# Altium footprint library Connectors.PcbLib: 135 footprints (part 8 of 9)
Each footprint in its own frame and in the unit in brackets; x right, y up, seen from the top. Pads: shape width x height; smd on the part's side, far side on the other; paste and mask are expansions set on the pad; w line width, h text height; cw(c..) or ccw(c..) is an arc to the next point about the centre after c.
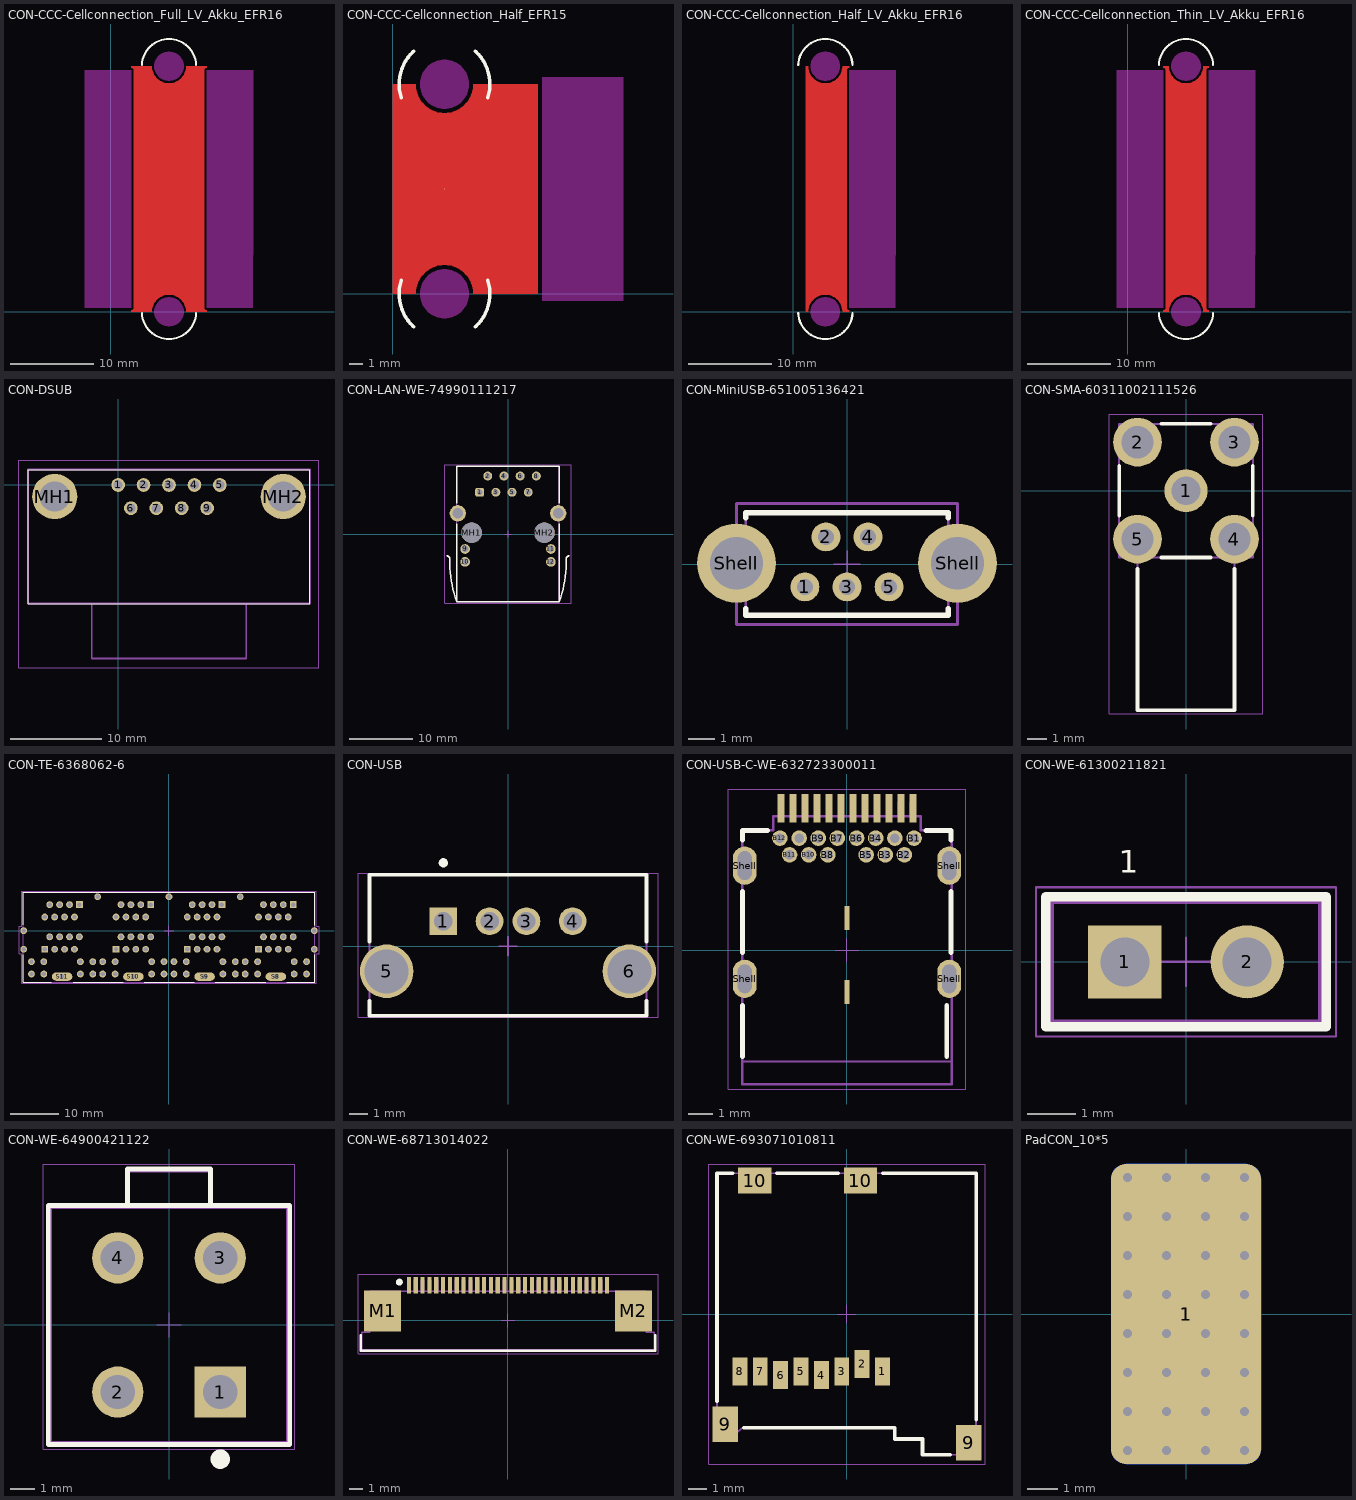
[diagram p7: the footprints below, top view; thin cyan lines are the x and y axes]

## CON-CCC-Cellconnection_Full_LV_Akku_EFR16 [mm]
pads (1):
  round 0.025 smd mask+0: 1(7,7.5)
Top Layer:
  region: 11.5,29.231 11.383,29.183 11.284,29.116 11.259,29.079 11.217,29.017 11.194,28.9 11.194,0.5 11.214,0.402 11.217,0.383 11.244,0.343 11.284,0.284 11.323,0.257 11.383,0.217 11.5,0.169 11.5,0 9.056,0 9.056,0.172 9.05,0.202 9.05,0.232 8.983,0.57 8.971,0.598 8.965,0.628 8.833,0.946 8.817,0.971 8.805,0.999 8.614,1.285 8.592,1.307 8.576,1.332 8.332,1.576 8.307,1.592 8.285,1.614 7.999,1.805 7.971,1.817 7.946,1.833 7.628,1.965 7.598,1.971 7.57,1.983 7.232,2.05 7.202,2.05 7.172,2.056 6.828,2.056 6.798,2.05 6.768,2.05 6.43,1.983 6.402,1.971 6.372,1.965 6.054,1.833 6.029,1.817 6.001,1.805 5.715,1.614 5.693,1.592 5.668,1.576 5.424,1.332 5.408,1.307 5.386,1.285 5.195,0.999 5.183,0.971 5.167,0.946 5.035,0.628 5.029,0.598 5.017,0.57 4.95,0.232 4.95,0.202 4.944,0.172 4.944,0 2.5,0 2.5,0.169 2.617,0.217 2.716,0.284 2.741,0.321 2.783,0.383 2.806,0.5 2.806,28.9 2.786,28.998 2.783,29.017 2.756,29.057 2.716,29.116 2.677,29.143 2.617,29.183 2.5,29.231 2.5,29.4 4.944,29.4 4.944,29.228 4.95,29.198 4.95,29.168 5.017,28.83 5.029,28.802 5.035,28.772 5.167,28.454 5.183,28.429 5.195,28.401 5.386,28.115 5.408,28.093 5.424,28.068 5.668,27.824 5.693,27.808 5.715,27.786 6.001,27.595 6.001,27.62 6.054,27.567 6.372,27.435 6.402,27.429 6.43,27.417 6.768,27.35 6.798,27.35 6.828,27.344 7.172,27.344 7.202,27.35 7.232,27.35 7.57,27.417 7.598,27.429 7.628,27.435 7.946,27.567 7.971,27.583 7.999,27.595 8.285,27.786 8.307,27.808 8.332,27.824 8.576,28.068 8.592,28.093 8.614,28.114 8.805,28.401 8.817,28.429 8.833,28.454 8.965,28.772 8.971,28.802 8.983,28.83 9.05,29.168 9.05,29.198 9.056,29.228 9.056,29.4 11.5,29.4
Top Overlay:
  lines w0.254: 3.754,-0.17 ccw(c7,0) 10.246,-0.17 ; 3.754,29.57 cw(c7,29.4) 10.246,29.57
Bottom Overlay:
  circle w0.254: c7,29.4 r3.25
  lines w0.254: 4.784,-2.377 cw(c7,0) 9.216,-2.377
Keep-Out Layer:
  board cut-out: -3.1,28.9 2.5,28.9 2.5,0.5 -3.1,0.5
  board cut-out: 7,31.15 6.828,31.15 6.49,31.083 6.171,30.951 5.884,30.759 5.641,30.516 5.449,30.229 5.317,29.91 5.25,29.572 5.25,29.4 5.25,29.228 5.317,28.89 5.449,28.571 5.641,28.284 5.884,28.041 6.171,27.849 6.49,27.717 6.828,27.65 7,27.65 7.172,27.65 7.51,27.717 7.829,27.849 8.116,28.041 8.359,28.284 8.551,28.571 8.683,28.89 8.75,29.228 8.75,29.4 8.75,29.572 8.683,29.91 8.551,30.229 8.359,30.516 8.116,30.759 7.829,30.951 7.51,31.083 7.172,31.15
  board cut-out: 7,1.75 6.828,1.75 6.49,1.683 6.171,1.551 5.884,1.359 5.641,1.116 5.449,0.829 5.317,0.51 5.25,0.172 5.25,0 5.25,-0.172 5.317,-0.51 5.449,-0.829 5.641,-1.116 5.884,-1.359 6.171,-1.551 6.49,-1.683 6.828,-1.75 7,-1.75 7.172,-1.75 7.51,-1.683 7.829,-1.551 8.116,-1.359 8.359,-1.116 8.551,-0.829 8.683,-0.51 8.75,-0.172 8.75,0 8.75,0.172 8.683,0.51 8.551,0.829 8.359,1.116 8.116,1.359 7.829,1.551 7.51,1.683 7.172,1.75
  board cut-out: 11.5,28.9 17.1,28.9 17.1,12.935 17.041,0.475 17.016,0.5 11.5,0.5

## CON-CCC-Cellconnection_Half_EFR15 [mm]
pads (1):
  round 0.025 smd mask+0: 1(3.7,7.5)
Top Layer:
  region: 10.394,0 5.756,0 5.756,0.172 5.75,0.202 5.75,0.232 5.683,0.57 5.671,0.598 5.665,0.628 5.533,0.946 5.517,0.971 5.505,0.999 5.314,1.285 5.292,1.307 5.276,1.332 5.032,1.576 5.007,1.592 4.985,1.614 4.699,1.805 4.671,1.817 4.646,1.833 4.328,1.965 4.298,1.971 4.27,1.983 3.932,2.05 3.902,2.05 3.872,2.056 3.528,2.056 3.498,2.05 3.468,2.05 3.13,1.983 3.102,1.971 3.072,1.965 2.754,1.833 2.729,1.817 2.701,1.805 2.415,1.614 2.393,1.592 2.368,1.576 2.124,1.332 2.108,1.307 2.086,1.285 1.895,0.999 1.883,0.971 1.867,0.946 1.735,0.628 1.729,0.598 1.717,0.57 1.65,0.232 1.65,0.202 1.644,0.172 1.644,0 0,0 0,15 1.644,15 1.644,14.828 1.65,14.798 1.65,14.768 1.717,14.43 1.729,14.402 1.735,14.372 1.867,14.054 1.883,14.029 1.895,14.001 2.086,13.715 2.108,13.693 2.124,13.668 2.368,13.424 2.393,13.408 2.415,13.386 2.701,13.195 2.729,13.183 2.754,13.167 3.072,13.035 3.102,13.029 3.13,13.017 3.468,12.95 3.498,12.95 3.528,12.944 3.872,12.944 3.902,12.95 3.932,12.95 4.27,13.017 4.298,13.029 4.328,13.035 4.646,13.167 4.671,13.183 4.699,13.195 4.985,13.386 5.007,13.408 5.032,13.424 5.276,13.668 5.292,13.693 5.314,13.714 5.505,14.001 5.517,14.029 5.533,14.054 5.665,14.372 5.671,14.402 5.683,14.43 5.75,14.768 5.75,14.798 5.756,14.828 5.756,15 10.394,15
Top Overlay:
  lines w0.254: 0.592,0.95 ccw(c3.7,0) 1.484,-2.377 ; 0.592,14.05 cw(c3.7,15) 1.484,17.377 ; 5.916,-2.377 ccw(c3.7,0) 6.808,0.95 ; 5.916,17.377 cw(c3.7,15) 6.808,14.05
Bottom Overlay:
  lines w0.254: 1.484,-2.377 cw(c3.7,0) 5.916,-2.377 ; 1.484,17.377 ccw(c3.7,15) 5.916,17.377
Keep-Out Layer:
  board cut-out: 3.7,16.75 3.528,16.75 3.19,16.683 2.871,16.551 2.584,16.359 2.341,16.116 2.149,15.829 2.017,15.51 1.95,15.172 1.95,15 1.95,14.828 2.017,14.49 2.149,14.171 2.341,13.884 2.584,13.641 2.871,13.449 3.19,13.317 3.528,13.25 3.7,13.25 3.872,13.25 4.21,13.317 4.529,13.449 4.816,13.641 5.059,13.884 5.251,14.171 5.383,14.49 5.45,14.828 5.45,15 5.45,15.172 5.383,15.51 5.251,15.829 5.059,16.116 4.816,16.359 4.529,16.551 4.21,16.683 3.872,16.75
  board cut-out: 3.7,1.75 3.528,1.75 3.19,1.683 2.871,1.551 2.584,1.359 2.341,1.116 2.149,0.829 2.017,0.51 1.95,0.172 1.95,0 1.95,-0.172 2.017,-0.51 2.149,-0.829 2.341,-1.116 2.584,-1.359 2.871,-1.551 3.19,-1.683 3.528,-1.75 3.7,-1.75 3.872,-1.75 4.21,-1.683 4.529,-1.551 4.816,-1.359 5.059,-1.116 5.251,-0.829 5.383,-0.51 5.45,-0.172 5.45,0 5.45,0.172 5.383,0.51 5.251,0.829 5.059,1.116 4.816,1.359 4.529,1.551 4.21,1.683 3.872,1.75
  board cut-out: 10.7,7.5 10.7,-0.5 16.5,-0.5 16.5,15.5 10.7,15.5

## CON-CCC-Cellconnection_Half_LV_Akku_EFR16 [mm]
pads (1):
  round 0.025 smd mask+0: 1(3.85,7.5)
Top Layer:
  region: 6.679,29.231 6.562,29.183 6.463,29.116 6.438,29.079 6.396,29.017 6.393,28.998 6.393,0.402 6.396,0.383 6.423,0.343 6.463,0.284 6.502,0.257 6.562,0.217 6.679,0.169 6.679,0 5.906,0 5.906,0.172 5.9,0.202 5.9,0.232 5.833,0.57 5.821,0.598 5.815,0.628 5.683,0.946 5.667,0.971 5.655,0.999 5.464,1.285 5.442,1.307 5.426,1.332 5.182,1.576 5.157,1.592 5.135,1.614 4.849,1.805 4.821,1.817 4.796,1.833 4.478,1.965 4.448,1.971 4.42,1.983 4.082,2.05 4.052,2.05 4.022,2.056 3.678,2.056 3.648,2.05 3.618,2.05 3.28,1.983 3.252,1.971 3.222,1.965 2.904,1.833 2.879,1.817 2.851,1.805 2.565,1.614 2.543,1.592 2.518,1.576 2.274,1.332 2.258,1.307 2.236,1.285 2.045,0.999 2.033,0.971 2.017,0.946 1.885,0.628 1.879,0.598 1.867,0.57 1.8,0.232 1.8,0.202 1.794,0.172 1.794,0 1.5,0 1.5,29.4 1.794,29.4 1.794,29.228 1.8,29.198 1.8,29.168 1.867,28.83 1.879,28.802 1.885,28.772 2.017,28.454 2.033,28.429 2.045,28.401 2.236,28.115 2.258,28.093 2.274,28.068 2.518,27.824 2.543,27.808 2.565,27.786 2.851,27.595 2.851,27.62 2.904,27.567 3.222,27.435 3.252,27.429 3.28,27.417 3.618,27.35 3.648,27.35 3.678,27.344 4.022,27.344 4.052,27.35 4.082,27.35 4.42,27.417 4.448,27.429 4.478,27.435 4.796,27.567 4.821,27.583 4.849,27.595 5.135,27.786 5.157,27.808 5.182,27.824 5.426,28.068 5.442,28.093 5.464,28.114 5.655,28.401 5.667,28.429 5.683,28.454 5.815,28.772 5.821,28.802 5.833,28.83 5.9,29.168 5.9,29.198 5.906,29.228 5.906,29.4 6.679,29.4
Top Overlay:
  lines w0.254: 0.604,-0.17 ccw(c3.85,0) 7.096,-0.17 ; 0.604,29.57 cw(c3.85,29.4) 7.096,29.57
Bottom Overlay:
  circle w0.254: c3.85,29.4 r3.25
  lines w0.254: 1.634,-2.377 cw(c3.85,0) 6.066,-2.377
Keep-Out Layer:
  board cut-out: 6.679,28.9 12.279,28.9 12.279,12.935 12.219,0.475 12.195,0.5 6.679,0.5
  board cut-out: 3.85,1.75 3.678,1.75 3.34,1.683 3.021,1.551 2.734,1.359 2.491,1.116 2.299,0.829 2.167,0.51 2.1,0.172 2.1,0 2.1,-0.172 2.167,-0.51 2.299,-0.829 2.491,-1.116 2.734,-1.359 3.021,-1.551 3.34,-1.683 3.678,-1.75 3.85,-1.75 4.022,-1.75 4.36,-1.683 4.679,-1.551 4.966,-1.359 5.209,-1.116 5.401,-0.829 5.533,-0.51 5.6,-0.172 5.6,0 5.6,0.172 5.533,0.51 5.401,0.829 5.209,1.116 4.966,1.359 4.679,1.551 4.36,1.683 4.022,1.75
  board cut-out: 3.85,31.15 3.678,31.15 3.34,31.083 3.021,30.951 2.734,30.759 2.491,30.516 2.299,30.229 2.167,29.91 2.1,29.572 2.1,29.4 2.1,29.228 2.167,28.89 2.299,28.571 2.491,28.284 2.734,28.041 3.021,27.849 3.34,27.717 3.678,27.65 3.85,27.65 4.022,27.65 4.36,27.717 4.679,27.849 4.966,28.041 5.209,28.284 5.401,28.571 5.533,28.89 5.6,29.228 5.6,29.4 5.6,29.572 5.533,29.91 5.401,30.229 5.209,30.516 4.966,30.759 4.679,30.951 4.36,31.083 4.022,31.15

## CON-CCC-Cellconnection_Thin_LV_Akku_EFR16 [mm]
pads (1):
  round 0.025 smd mask+0: 1(7,7.5)
Top Layer:
  region: 9.707,29.231 9.59,29.183 9.491,29.116 9.466,29.079 9.424,29.017 9.401,28.9 9.401,0.5 9.421,0.402 9.424,0.383 9.451,0.343 9.491,0.284 9.53,0.257 9.59,0.217 9.707,0.169 9.707,0 9.056,0 9.056,0.172 9.05,0.202 9.05,0.232 8.983,0.57 8.971,0.598 8.965,0.628 8.833,0.946 8.817,0.971 8.805,0.999 8.614,1.285 8.592,1.307 8.576,1.332 8.332,1.576 8.307,1.592 8.285,1.614 7.999,1.805 7.971,1.817 7.946,1.833 7.628,1.965 7.598,1.971 7.57,1.983 7.232,2.05 7.202,2.05 7.172,2.056 6.828,2.056 6.798,2.05 6.768,2.05 6.43,1.983 6.402,1.971 6.372,1.965 6.054,1.833 6.029,1.817 6.001,1.805 5.715,1.614 5.693,1.592 5.668,1.576 5.424,1.332 5.408,1.307 5.386,1.285 5.195,0.999 5.183,0.971 5.167,0.946 5.035,0.628 5.029,0.598 5.017,0.57 4.95,0.232 4.95,0.202 4.944,0.172 4.944,0 4.293,0 4.293,0.169 4.41,0.217 4.509,0.284 4.534,0.321 4.576,0.383 4.599,0.5 4.599,28.9 4.591,28.969 4.576,29.017 4.534,29.057 4.509,29.116 4.47,29.143 4.41,29.183 4.293,29.231 4.293,29.4 4.944,29.4 4.944,29.228 4.95,29.198 4.95,29.168 5.017,28.83 5.029,28.802 5.035,28.772 5.167,28.454 5.183,28.429 5.195,28.401 5.386,28.115 5.408,28.093 5.424,28.068 5.668,27.824 5.693,27.808 5.715,27.786 6.001,27.595 6.001,27.62 6.054,27.567 6.372,27.435 6.402,27.429 6.43,27.417 6.768,27.35 6.798,27.35 6.828,27.344 7.172,27.344 7.202,27.35 7.232,27.35 7.57,27.417 7.598,27.429 7.628,27.435 7.946,27.567 7.971,27.583 7.999,27.595 8.285,27.786 8.307,27.808 8.332,27.824 8.576,28.068 8.592,28.093 8.614,28.114 8.805,28.401 8.817,28.429 8.833,28.454 8.965,28.772 8.971,28.802 8.983,28.83 9.05,29.168 9.05,29.198 9.056,29.228 9.056,29.4 9.707,29.4
Top Overlay:
  lines w0.254: 3.754,-0.17 ccw(c7,0) 10.246,-0.17 ; 3.754,29.57 cw(c7,29.4) 10.246,29.57
Bottom Overlay:
  circle w0.254: c7,29.4 r3.25
  lines w0.254: 4.784,-2.377 cw(c7,0) 9.216,-2.377
Keep-Out Layer:
  board cut-out: 7,1.75 6.828,1.75 6.49,1.683 6.171,1.551 5.884,1.359 5.641,1.116 5.449,0.829 5.317,0.51 5.25,0.172 5.25,0 5.25,-0.172 5.317,-0.51 5.449,-0.829 5.641,-1.116 5.884,-1.359 6.171,-1.551 6.49,-1.683 6.828,-1.75 7,-1.75 7.172,-1.75 7.51,-1.683 7.829,-1.551 8.116,-1.359 8.359,-1.116 8.551,-0.829 8.683,-0.51 8.75,-0.172 8.75,0 8.75,0.172 8.683,0.51 8.551,0.829 8.359,1.116 8.116,1.359 7.829,1.551 7.51,1.683 7.172,1.75
  board cut-out: 7,31.15 6.828,31.15 6.49,31.083 6.171,30.951 5.884,30.759 5.641,30.516 5.449,30.229 5.317,29.91 5.25,29.572 5.25,29.4 5.25,29.228 5.317,28.89 5.449,28.571 5.641,28.284 5.884,28.041 6.171,27.849 6.49,27.717 6.828,27.65 7,27.65 7.172,27.65 7.51,27.717 7.829,27.849 8.116,28.041 8.359,28.284 8.551,28.571 8.683,28.89 8.75,29.228 8.75,29.4 8.75,29.572 8.683,29.91 8.551,30.229 8.359,30.516 8.116,30.759 7.829,30.951 7.51,31.083 7.172,31.15
  board cut-out: -1.307,28.9 4.293,28.9 4.293,0.5 -1.307,0.5
  board cut-out: 9.707,28.9 15.307,28.9 15.307,12.935 15.248,0.475 15.223,0.5 9.707,0.5

## CON-DSUB [mm]
pads (11):
  round 1.5 hole 1: 1(0,0) 2(2.78,0) 3(5.56,0) 4(8.34,0) 5(11.12,0) 6(1.39,-2.54) 7(4.17,-2.54) 8(6.95,-2.54) 9(9.73,-2.54)
  round 4.95 hole 3.3: MH1(-6.935,-1.27) MH2(18.055,-1.27)
Top Overlay:
  lines w0.1: -9.845,-12.97 -9.845,1.68 20.965,1.68 20.965,-12.97 -9.845,-12.97
Top Component Outline:
  lines w0.2: -2.89,-12.97 -2.89,-18.97 14.01,-18.97 14.01,-12.97 ; -9.845,-12.97 20.965,-12.97 20.965,1.68 -9.845,1.68 -9.845,-12.97
Top Courtyard (Mech26):
  lines w0.1: -10.845,-19.97 21.965,-19.97 21.965,2.68 -10.845,2.68 -10.845,-19.97
3D body "2301843-1.stp": height 13.59, standoff -3.79, extent -9.855,-18.95 20.955,1.7

## CON-LAN-WE-74990111217 [mm] "LAN Transformer, body 21.3x16mm"
height 15.01
pads (16):
  rrect50% 1.4x1.4 hole 0.89: 1(-4.445,6.55)
  round 1.4 hole 0.89: 2(-3.175,9.09) 3(-1.905,6.55) 4(-0.635,9.09) 5(0.635,6.55) 6(1.905,9.09) 7(3.175,6.55) 8(4.445,9.09)
  round 1.52 hole 1.02: 9(-6.725,-2.34) 10(-6.725,-4.37) 11(6.725,-2.34) 12(6.725,-4.37)
  round 3.2 hole 3.2 unplated: MH1(-5.715,0.2) MH2(5.715,0.2)
  round 2.55 hole 1.7: Shell(-7.875,3.25) Shell(7.875,3.25)
Top Overlay:
  lines w0.2: -9.607,-3.411 cw(c-9.705,-4) -9.108,-4 ccw(c7.2,-4.7) -8.013,-10.616 ; -8,1.65 -8,-10.65 8,-10.65 8,1.65 ; -8,4.8 -8,10.65 8,10.65 8,4.8 ; 8.013,-10.616 ccw(c-7.2,-4.7) 9.108,-4 cw(c9.705,-4) 9.607,-3.411
Bottom Courtyard (Mech15):
  lines w0.05: -0.5,0 0.5,0 ; 0,-0.5 0,0.5
Top Component Outline:
  lines w0.1: -9.607,-3.411 cw(c-9.705,-4) -9.108,-4 ccw(c7.2,-4.7) -8.013,-10.616 ; 8.013,-10.616 ccw(c-7.2,-4.7) 9.108,-4 cw(c9.705,-4) 9.607,-3.411 ; -8,-10.65 -8,10.65 8,10.65 8,-10.65 -8,-10.65
Top Courtyard (Mech26):
  lines w0.05: -9.907,-10.85 9.907,-10.85 9.907,10.85 -9.907,10.85 -9.907,-10.85
3D body "74990111217.stp": height 15.34, standoff -3.09, extent -9.724,-10.65 9.724,10.65

## CON-MiniUSB-651005136421 [mm] "Mini USB 2.0 Type B Vertical 5 Contacts"
height 9.2
pads (7):
  round 1.1 hole 0.6: 1(-1.6,-0.87) 2(-0.8,1.03) 3(0,-0.87) 4(0.8,1.03) 5(1.6,-0.87)
  round 3 hole 2: Shell(-4.2,0.03) Shell(4.2,0.03)
Top Overlay:
  lines w0.2: -3.85,-1.7 -3.85,-1.95 3.85,-1.95 3.85,-1.7 ; -3.85,1.75 -3.85,1.95 3.85,1.95 3.85,1.75
Top Component Center:
  lines w0.05: -0.5,0 0.5,0 ; 0,-0.5 0,0.5
Top Component Outline:
  lines w0.1: -3.85,-1.95 3.85,-1.95 3.85,1.95 -3.85,1.95 -3.85,-1.95
Top Courtyard (Mech26):
  lines w0.1: -4.2,-2.3 -4.2,2.3 4.2,2.3 4.2,-2.3 -4.2,-2.3
3D body "651005136421.stp": height 9.4, standoff -2.6, extent -5.099,-1.92 5.099,1.98

## CON-SMA-60311002111526 [mm] "SMA PCB THT Jack"
height 9.86
pads (5):
  round 2.25 hole 1.5: 1(0,0)
  round 2.55 hole 1.7: 2(-2.54,2.54) 3(2.54,2.54) 4(2.54,-2.54) 5(-2.54,-2.54)
Top Overlay:
  lines w0.2: -3.5,-1.3 -3.5,1.3 ; -2.54,-4.1 -2.54,-11.5 2.54,-11.5 2.54,-4.1 ; -1.3,-3.5 1.3,-3.5 ; -1.3,3.5 1.3,3.5 ; 3.5,-1.3 3.5,1.3
Top Component Center:
  lines w0.05: -0.5,0 0.5,0 ; 0,-0.5 0,0.5
Top Component Outline:
  lines w0.1: -2.54,-3.5 -2.54,-11.5 2.54,-11.5 2.54,-3.5 ; -3.5,-3.5 -3.5,3.5 3.5,3.5 3.5,-3.5 -3.5,-3.5
Top Courtyard (Mech26):
  lines w0.05: -4.015,-11.7 4.015,-11.7 4.015,4.015 -4.015,4.015 -4.015,-11.7
3D body "60311002111526.stp": height 9.86, standoff -3.94, extent -3.5,-11.5 3.5,3.5

## CON-TE-6368062-6 [mm]
height 17.28
pads (107):
  rect 1.398x1.398 hole 0.89 mask+0: P1.1(-25.465,-3.81) P2.1(-10.855,-3.81) P3.1(3.745,-3.81) P4.1(18.355,-3.81) P5.1(-18.36,5.33) P6.1(-3.75,5.33) P7.1(10.85,5.33) P8.1(25.46,5.33)
  round 1.398 hole 0.89 mask+0: P1.2(-24.45,-1.27) P1.3(-23.435,-3.81) P1.4(-22.42,-1.27) P1.5(-21.405,-3.81) P1.6(-20.39,-1.27) P1.7(-19.375,-3.81) P1.8(-18.36,-1.27) P1.A1(-18.155,-8.89) P1.A2(-28.195,-8.89) P1.C1(-15.615,-8.89) P1.C2(-25.655,-8.89) P2.2(-9.84,-1.27) P2.3(-8.825,-3.81) P2.4(-7.81,-1.27) P2.5(-6.795,-3.81) P2.6(-5.78,-1.27) P2.7(-4.765,-3.81) P2.8(-3.75,-1.27) P2.A1(-3.555,-8.89) P2.A2(-13.585,-8.89) P2.C1(-1.015,-8.89) P2.C2(-11.045,-8.89) P3.2(4.76,-1.27) P3.3(5.775,-3.81) P3.4(6.79,-1.27) P3.5(7.805,-3.81) P3.6(8.82,-1.27) P3.7(9.835,-3.81) P3.8(10.85,-1.27) P3.A1(11.055,-8.89) P3.A2(1.015,-8.89) P3.C1(13.595,-8.89) P3.C2(3.555,-8.89) P4.2(19.37,-1.27) P4.3(20.385,-3.81) P4.4(21.4,-1.27) P4.5(22.415,-3.81) P4.6(23.43,-1.27) P4.7(24.445,-3.81) P4.8(25.46,-1.27) P4.A1(25.665,-8.89) P4.A2(15.625,-8.89) P4.C1(28.205,-8.89) P4.C2(18.165,-8.89) P5.2(-19.375,2.79) P5.3(-20.39,5.33) P5.4(-21.405,2.79) P5.5(-22.42,5.33) P5.6(-23.435,2.79) P5.7(-24.45,5.33) P5.8(-25.465,2.79) P5.A1(-18.155,-6.35) P5.A2(-28.195,-6.35) P5.C1(-15.615,-6.35) P5.C2(-25.655,-6.35) P6.2(-4.765,2.79) P6.3(-5.78,5.33) P6.4(-6.795,2.79) P6.5(-7.81,5.33) P6.6(-8.825,2.79) P6.7(-9.84,5.33) P6.8(-10.855,2.79) P6.A1(-3.555,-6.35) P6.A2(-13.585,-6.35) P6.C1(-1.015,-6.35) P6.C2(-11.045,-6.35) P7.2(9.835,2.79) P7.3(8.82,5.33) P7.4(7.805,2.79) P7.5(6.79,5.33) P7.6(5.775,2.79) P7.7(4.76,5.33) P7.8(3.745,2.79) P7.A1(11.055,-6.35) P7.A2(1.015,-6.35) P7.C1(13.595,-6.35) P7.C2(3.555,-6.35) P8.2(24.445,2.79) P8.3(23.43,5.33) P8.4(22.415,2.79) P8.5(21.4,5.33) P8.6(20.385,2.79) P8.7(19.37,5.33) P8.8(18.355,2.79) P8.A1(25.665,-6.35) P8.A2(15.625,-6.35) P8.C1(28.205,-6.35) P8.C2(18.165,-6.35) S1(-29.785,-3.81) S2(-29.785,0) S3(-14.61,6.95) S4(0,6.95) S5(14.61,6.95) S6(29.795,0) S7(29.795,-3.81)
  oval 4.2x1.7 hole 1 square mask+0: S8(21.91,-9.42) S9(7.3,-9.42) S10(-7.295,-9.42) S11(-21.91,-9.42)
Top Overlay:
  lines w0.127: -29.905,-4.9 -29.905,-10.55 -24.095,-10.55 ; -29.905,1.2 -29.905,7.85 29.915,7.85 29.915,1.1 ; -19.595,-10.55 -9.395,-10.55 ; -5.095,-10.55 5.205,-10.55 ; 9.505,-10.55 19.805,-10.55 ; 24.105,-10.55 29.915,-10.55 29.915,-4.9
Assembly Notes:
  lines w0.1: -25,-10.55 25,-10.55
Top Component Center:
  lines w0.1: -1,0 1,0 ; 0,-1 0,1
Top Component Outline:
  lines w0.127: -29.91,-10.54 -29.91,7.85 29.91,7.85 29.91,-10.54 -29.91,-10.54
Top Courtyard (Mech26):
  lines w0.05: -30.745,-4.75 -30.745,0.95 -30.155,0.95 -30.155,8.1 30.165,8.1 30.165,0.95 30.755,0.95 30.755,-4.75 30.165,-4.75 30.165,-10.75 -30.155,-10.75 -30.155,-4.75 -30.745,-4.75
3D body "c-6368062-6-d-3d.stp": height 18.1, standoff -6.68, extent -30.809,-23.96 30.809,7.1

## CON-USB [mm] "Connector, 6-Leads, Body 7.62x15mm"
height 15
pads (6):
  rect 1.5x1.5 hole 1: 1(-3.5,1.355)
  round 1.5 hole 1: 2(-1,1.355) 3(1,1.355) 4(3.5,1.355)
  round 2.9 hole 2.38: 5(-6.57,-1.355) 6(6.57,-1.355)
Top Overlay:
  circle w0.25: c-3.5,4.515 r0.125
  lines w0.2: -7.5,-2.954 -7.5,-3.755 7.5,-3.755 7.5,-2.954 ; -7.5,0.244 -7.5,3.865 7.5,3.865 7.5,0.244
Top Component Center:
  lines w0.1: -0.5,0 0.5,0 ; 0,-0.5 0,0.5
Top Component Outline:
  lines w0.1: -7.5,-3.755 7.5,-3.755 7.5,3.865 -7.5,3.865 -7.5,-3.755
Top Courtyard (Mech26):
  lines w0.05: -8.12,-3.855 8.12,-3.855 8.12,3.965 -8.12,3.965 -8.12,-3.855
3D body: height 15, standoff 0, extent -7.5,-3.755 7.5,3.865
3D body: height 0, standoff -2.8, extent 3.183,1.038 3.818,1.673
3D body: height 0, standoff -2.8, extent 0.683,1.038 1.318,1.673
3D body: height 0, standoff -2.8, extent -1.317,1.038 -0.682,1.673
3D body: height 0, standoff -2.8, extent -3.817,1.038 -3.182,1.673

## CON-USB-C-WE-632723300011 [mm] "USB 3.1 Type C Receptacle Horizontal THR"
height 2.96
pads (32):
  rect 0.3x1.2 smd: A1(-2.75,5.93) A2(-2.25,5.93) A3(-1.75,5.93) A4(-1.25,5.93) A5(-0.75,5.93) A6(-0.25,5.93) A7(0.25,5.93) A8(0.75,5.93) A9(1.25,5.93) A10(1.75,5.93) A11(2.25,5.93) A12(2.75,5.93)
  round 0.65 hole 0.4: B1(2.8,4.68) B2(2.4,3.98) B3(1.6,3.98) B4(1.2,4.68) B5(0.8,3.98) B6(0.4,4.68) B7(-0.4,4.68) B8(-0.8,3.98) B9(-1.2,4.68) B10(-1.6,3.98) B11(-2.4,3.98) B12(-2.8,4.68) Shell(-2,4.68) Shell(2,4.68)
  oval 1x1.6 hole 0.6 slot 1.2 at 90 deg: Shell(-4.27,-1.2) Shell(-4.27,3.53) Shell(4.27,-1.2) Shell(4.27,3.53)
  rect 0.2x1 smd: Shell(0,-1.75) Shell(0,1.35)
Top Overlay:
  lines w0.2: -4.37,-4.45 -4.37,-2.3 ; -4.37,-0.1 -4.37,2.45 ; -4.37,4.6 -4.37,5 -3.32,5 ; 3.29,5 4.34,5 4.34,4.6 ; 4.17,-4.45 4.17,-2.3 ; 4.34,-0.1 4.34,2.45
Assembly Notes:
  lines w0.1: -4.37,-4.65 4.37,-4.65
  text "PCB Edge" at -1.7,-5.6 h0.61
Top Component Center:
  lines w0.05: -0.5,0 0.5,0 ; 0,-0.5 0,0.5
Top Component Outline:
  lines w0.05: -2.85,5.6 -2.85,6.19 -2.65,6.19 -2.65,5.6 ; -2.35,5.6 -2.35,6.19 -2.15,6.19 -2.15,5.6 ; -1.85,5.6 -1.85,6.19 -1.65,6.19 -1.65,5.6 ; -1.35,5.6 -1.35,6.19 -1.15,6.19 -1.15,5.6 ; -0.85,5.6 -0.85,6.19 -0.65,6.19 -0.65,5.6 ; -0.35,5.6 -0.35,6.19 -0.15,6.19 -0.15,5.6 ; 0.15,5.6 0.15,6.19 0.35,6.19 0.35,5.6 ; 0.65,5.6 0.65,6.19 0.85,6.19 0.85,5.6 ; 1.15,5.6 1.15,6.19 1.35,6.19 1.35,5.6 ; 1.65,5.6 1.65,6.19 1.85,6.19 1.85,5.6 ; 2.15,5.6 2.15,6.19 2.35,6.19 2.35,5.6 ; 2.65,5.6 2.65,6.19 2.85,6.19 2.85,5.6
  lines w0.1: 4.34,-5.6 -4.37,-5.6 -4.37,5 -3.08,5 -3.08,5.6 3.08,5.6 3.08,5 4.37,5 4.37,-5.6
Top Courtyard (Mech26):
  lines w0.05: -4.97,-5.8 -4.97,6.73 4.97,6.73 4.97,-5.8 -4.97,-5.8
Top Designator:
  text ".Designator" at -7.498,-0.5 h1.5
3D body "632723300011.stp": height 3.05, standoff -1.81, extent -4.37,-5.6 4.37,6.194

## CON-WE-61300211821 [mm] "Socket Header, Pitch 2.54 mm, THT, Vertical, single row, 2p"
height 8.5
pads (2):
  rect 1.52x1.52 hole 1.02: 1(-1.27,0)
  round 1.52 hole 1.02: 2(1.27,0)
Top Overlay:
  lines w0.2: -2.915,-1.35 -2.915,1.35 2.915,1.35 2.915,-1.35 -2.915,-1.35
  text "1" at -1.4,1.7 h0.8
Top Component Center:
  lines w0.05: -0.5,0 0.5,0 ; 0,-0.5 0,0.5
Top Component Outline:
  lines w0.1: -2.79,-1.25 -2.79,1.25 2.79,1.25 2.79,-1.25 -2.79,-1.25
Top Courtyard (Mech26):
  lines w0.05: -3.115,-1.55 3.115,-1.55 3.115,1.55 -3.115,1.55 -3.115,-1.55
3D body "61300211821.stp": height 8.55, standoff -3.06, extent -2.79,-1.25 2.79,1.25

## CON-WE-64900421122 [mm] "4.20mm Male Dual Row Vertical Header, 4p"
height 12.8
pads (4):
  rect 2.1x2.1 hole 1.4: 1(2.1,-2.75)
  round 2.1 hole 1.4: 2(-2.1,-2.75) 3(2.1,2.75) 4(-2.1,2.75)
Top Overlay:
  circle w0.4: c2.1,-5.5 r0.2
  lines w0.2: -1.7,4.9 -1.7,6.4 1.7,6.4 1.7,4.9 ; -4.95,-4.9 -4.95,4.9 4.95,4.9 4.95,-4.9 -4.95,-4.9
Top Component Center:
  lines w0.05: -0.5,0 0.5,0 ; 0,-0.5 0,0.5
Top Component Outline:
  lines w0.1: -1.7,4.8 -1.7,6.3 1.7,6.3 1.7,4.8 ; -4.85,-4.8 4.85,-4.8 4.85,4.8 -4.85,4.8 -4.85,-4.8
Top Courtyard (Mech26):
  lines w0.05: -5.15,-5.1 -5.15,6.6 5.15,6.6 5.15,-5.1 -5.15,-5.1
3D body "64900421122.stp": height 12.85, standoff -3.45, extent -4.85,-4.8 5.15,6.3

## CON-WE-68713014022 [mm] "ZIF Connectors, Horizontal, Top Contact, pitch 0.5mm, 30p"
height 2.25
pads (32):
  rect 0.3x1.2 smd mask+0: 1(-7.25,2.56) 2(-6.75,2.56) 3(-6.25,2.56) 4(-5.75,2.56) 5(-5.25,2.56) 6(-4.75,2.56) 7(-4.25,2.56) 8(-3.75,2.56) 9(-3.25,2.56) 10(-2.75,2.56) 11(-2.25,2.56) 12(-1.75,2.56) 13(-1.25,2.56) 14(-0.75,2.56) 15(-0.25,2.56) 16(0.25,2.56) 17(0.75,2.56) 18(1.25,2.56) 19(1.75,2.56) 20(2.25,2.56) 21(2.75,2.56) 22(3.25,2.56) 23(3.75,2.56) 24(4.25,2.56) 25(4.75,2.56) 26(5.25,2.56) 27(5.75,2.56) 28(6.25,2.56) 29(6.75,2.56) 30(7.25,2.56)
  rect 2.7x3 smd mask+0: M1(-9.18,0.7) M2(9.18,0.7)
Top Overlay:
  circle w0.25: c-7.95,2.8 r0.125
  lines w0.2: -10.775,-1.1 -10.775,-2.225 10.775,-2.225 10.775,-1.1
Top Component Center:
  lines w0.05: -0.5,0 0.5,0 ; 0,-0.5 0,0.5
Top Component Outline:
  lines w0.1: -7.35,2.15 -7.35,2.95 -7.15,2.95 -7.15,2.15 ; -6.85,2.15 -6.85,2.95 -6.65,2.95 -6.65,2.15 ; -6.35,2.15 -6.35,2.95 -6.15,2.95 -6.15,2.15 ; -5.85,2.15 -5.85,2.95 -5.65,2.95 -5.65,2.15 ; -5.35,2.15 -5.35,2.95 -5.15,2.95 -5.15,2.15 ; -4.85,2.15 -4.85,2.95 -4.65,2.95 -4.65,2.15 ; -4.35,2.15 -4.35,2.95 -4.15,2.95 -4.15,2.15 ; -3.85,2.15 -3.85,2.95 -3.65,2.95 -3.65,2.15 ; -3.35,2.15 -3.35,2.95 -3.15,2.95 -3.15,2.15 ; -2.85,2.15 -2.85,2.95 -2.65,2.95 -2.65,2.15 ; -2.35,2.15 -2.35,2.95 -2.15,2.95 -2.15,2.15 ; -1.85,2.15 -1.85,2.95 -1.65,2.95 -1.65,2.15 ; -1.35,2.15 -1.35,2.95 -1.15,2.95 -1.15,2.15 ; -0.85,2.15 -0.85,2.95 -0.65,2.95 -0.65,2.15 ; -0.35,2.15 -0.35,2.95 -0.15,2.95 -0.15,2.15 ; 0.15,2.15 0.15,2.95 0.35,2.95 0.35,2.15 ; 0.65,2.15 0.65,2.95 0.85,2.95 0.85,2.15 ; 1.15,2.15 1.15,2.95 1.35,2.95 1.35,2.15 ; 1.65,2.15 1.65,2.95 1.85,2.95 1.85,2.15 ; 2.15,2.15 2.15,2.95 2.35,2.95 2.35,2.15 ; 2.65,2.15 2.65,2.95 2.85,2.95 2.85,2.15 ; 3.15,2.15 3.15,2.95 3.35,2.95 3.35,2.15 ; 3.65,2.15 3.65,2.95 3.85,2.95 3.85,2.15 ; 4.15,2.15 4.15,2.95 4.35,2.95 4.35,2.15 ; 4.65,2.15 4.65,2.95 4.85,2.95 4.85,2.15 ; 5.15,2.15 5.15,2.95 5.35,2.95 5.35,2.15 ; 5.65,2.15 5.65,2.95 5.85,2.95 5.85,2.15 ; 6.15,2.15 6.15,2.95 6.35,2.95 6.35,2.15 ; 6.65,2.15 6.65,2.95 6.85,2.95 6.85,2.15 ; 7.15,2.15 7.15,2.95 7.35,2.95 7.35,2.15 ; -10.7,-2.15 -10.7,-0.85 -10.1,-0.85 -10.1,2.15 10.1,2.15 10.1,-0.85 10.7,-0.85 10.7,-2.15 -10.7,-2.15
Top Courtyard (Mech26):
  lines w0.05: -10.975,-2.425 -10.975,3.36 10.975,3.36 10.975,-2.425 -10.975,-2.425
Top Designator:
  text ".Designator" at -7.498,-0.5 h1.5
3D body "68713014022.stp": height 2.1, standoff 0, extent -10.7,-2.15 10.7,2.95

## CON-WE-693071010811 [mm] "Micro SD Card Connector Push & Push - with Card Detection - 8 Pins"
height 1.98
pads (12):
  rect 0.8x1.5 smd: 1(1.94,-3.1) 2(0.84,-2.7) 3(-0.26,-3.1) 4(-1.36,-3.3) 5(-2.46,-3.1) 6(-3.56,-3.3) 7(-4.66,-3.1) 8(-5.76,-3.1)
  rect 1.4x1.9 smd: 9(-6.55,-5.95) 9(6.6,-6.95)
  rect 1.8x1.4 smd: 10(-4.95,7.2) 10(0.75,7.2)
Top Overlay:
  lines w0.2: -7,-4.7 -7,7.6 -6.15,7.6 ; -5.55,-6.15 2.6,-6.15 2.6,-6.75 4.1,-6.75 4.1,-7.6 5.6,-7.6 ; -3.75,7.6 -0.45,7.6 ; 1.95,7.6 7,7.6 7,-5.7
Top Component Center:
  lines w0.05: -0.5,0 0.5,0 ; 0,-0.5 0,0.5
Top Component Outline:
  lines w0.1: -6.2,-6.6 -7,-6.6 -7,7.6 7,7.6 7,-7.6 4.1,-7.6 4.1,-6.75 2.6,-6.75 2.6,-6.15 -5.6,-6.15 -6.199,-6.601
Top Courtyard (Mech26):
  lines w0.05: -7.45,-8.1 -7.45,8.1 7.5,8.1 7.5,-8.1 -7.45,-8.1
Top Designator:
  text ".Designator" at -7.498,-0.5 h1.5
3D body "693071010811.stp": height 1.85, standoff -0.05, extent -7,-7.61 7,7.6

## PadCON_10*5 [mm] "Pretty Awesome Device for Connection"
pads (2):
  rrect20% 5x10 smd: 1(0,0)
  rrect20% 5x10 smd far side: 1(0,0)
via 1.95,4.55 diameter 0.65 hole 0.3
via 0.65,4.55 diameter 0.65 hole 0.3
via -0.65,4.55 diameter 0.65 hole 0.3
via -1.95,4.55 diameter 0.65 hole 0.3
via 1.95,3.25 diameter 0.65 hole 0.3
via 0.65,3.25 diameter 0.65 hole 0.3
via -0.65,3.25 diameter 0.65 hole 0.3
via -1.95,3.25 diameter 0.65 hole 0.3
via 1.95,1.95 diameter 0.65 hole 0.3
via 0.65,1.95 diameter 0.65 hole 0.3
via -0.65,1.95 diameter 0.65 hole 0.3
via -1.95,1.95 diameter 0.65 hole 0.3
via 1.95,0.65 diameter 0.65 hole 0.3
via 0.65,0.65 diameter 0.65 hole 0.3
via -0.65,0.65 diameter 0.65 hole 0.3
via -1.95,0.65 diameter 0.65 hole 0.3
via 1.95,-0.65 diameter 0.65 hole 0.3
via 0.65,-0.65 diameter 0.65 hole 0.3
via -0.65,-0.65 diameter 0.65 hole 0.3
via -1.95,-0.65 diameter 0.65 hole 0.3
via 1.95,-1.95 diameter 0.65 hole 0.3
via 0.65,-1.95 diameter 0.65 hole 0.3
via -0.65,-1.95 diameter 0.65 hole 0.3
via -1.95,-1.95 diameter 0.65 hole 0.3
via 1.95,-3.25 diameter 0.65 hole 0.3
via 0.65,-3.25 diameter 0.65 hole 0.3
via -0.65,-3.25 diameter 0.65 hole 0.3
via -1.95,-3.25 diameter 0.65 hole 0.3
via 1.95,-4.55 diameter 0.65 hole 0.3
via 0.65,-4.55 diameter 0.65 hole 0.3
via -0.65,-4.55 diameter 0.65 hole 0.3
via -1.95,-4.55 diameter 0.65 hole 0.3